# Altium integrated library Weidmueller_OMNIMATE_Signal.IntLib: 2550 symbols (part 39 of 45)
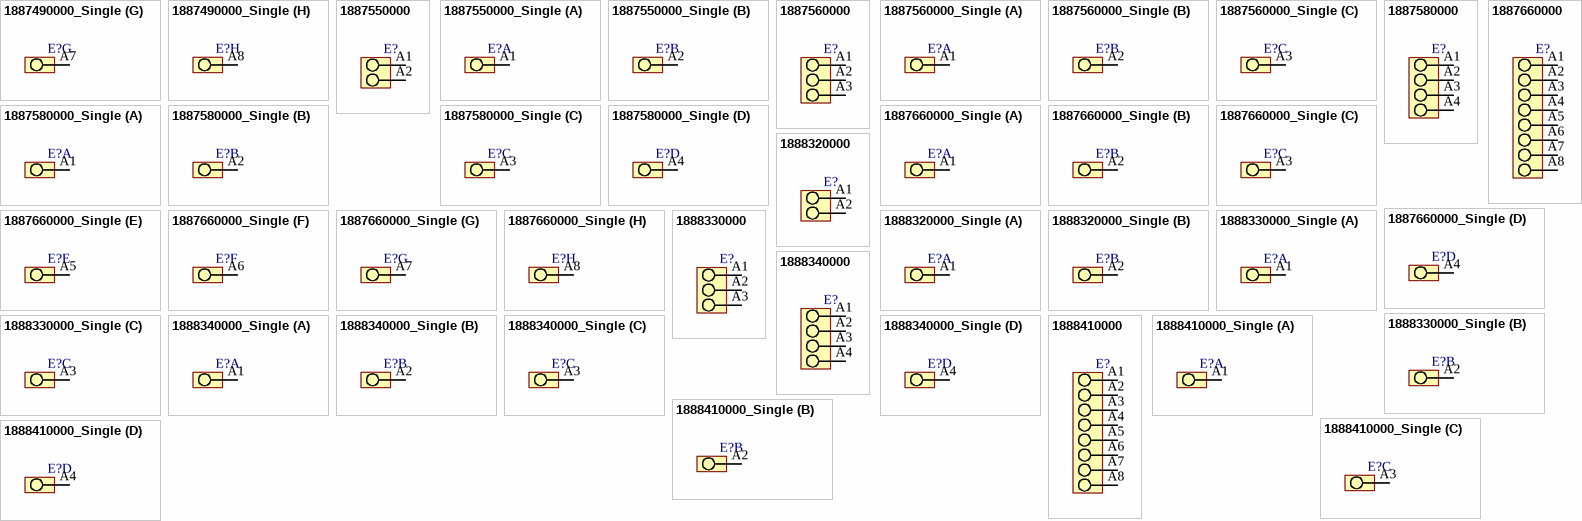
[diagram p249: symbols 1887490000_Single to 1888410000_Single]

## 1887550000
designator E?
OMNIMATE Signal - series LSF; PartNumber: 1887550000; Manufacturer: Weidmueller; Short_text_for_material: LSF-SMT 3.50/02/135 1.5SN BK RL; Side_termination_characteristic: closed side; Mounting_onto_the_PCB: Reflow solder connection; Pitch_mm: 3,5 mm; Pitch_inch: 0,138 inch; No_of_poles: 2; Solder_pin_length_mm: 1,5 mm; Contact_material: Cu-Leg; Contact_surface: tinned; Insulating_material: LCP GF; UL_94_flammability_rating: V-0; Rated_voltage_for_surge_voltage_class_pollution_degree_II_2: 320 V; Rated_current_min_no_of_poles_TU_20_deg_C: 17,5 A; Solid_min_H05_07_V_U: 0,2 mm²; Solid_max_H05_07_V_U: 1,5 mm²; Rated_voltage_use_group_B_UL_1059: 300 V; Rated_current_use_group_B_UL_1059: 12 A; Wire_cross_section_AWG_min_UL_1059: AWG 24; Wire_cross_section_AWG_max_UL_1059: AWG 16; PackageReference: LSF_SMT_3_5_135_02; Colour: Black; Packaging: Tape; Qty: 190 PCS; Revision: V1; ComponentLink1Description: Manufacturer URL; ComponentLink1URL: http://www.weidmueller.com/; ComponentLink2Description: URL Link1; ComponentLink2URL: http://catalog.weidmueller.com/catalog/Start.do?localeId=en&ObjectID=1887550000
footprint LSF_SMT_3_5_135_02 (OMNIMATE Signal - Serie LSF  LSF-SMT 3.50/02/135 1.5)
pins: A1, A2
1 alternate drawing of the same symbol

## 1887550000_Single
designator E?
OMNIMATE Signal - series LSF; PartNumber: 1887550000; Manufacturer: Weidmueller; Short_text_for_material: LSF-SMT 3.50/02/135 1.5SN BK RL; Side_termination_characteristic: closed side; Mounting_onto_the_PCB: Reflow solder connection; Pitch_mm: 3,5 mm; Pitch_inch: 0,138 inch; No_of_poles: 2; Solder_pin_length_mm: 1,5 mm; Contact_material: Cu-Leg; Contact_surface: tinned; Insulating_material: LCP GF; UL_94_flammability_rating: V-0; Rated_voltage_for_surge_voltage_class_pollution_degree_II_2: 320 V; Rated_current_min_no_of_poles_TU_20_deg_C: 17,5 A; Solid_min_H05_07_V_U: 0,2 mm²; Solid_max_H05_07_V_U: 1,5 mm²; Rated_voltage_use_group_B_UL_1059: 300 V; Rated_current_use_group_B_UL_1059: 12 A; Wire_cross_section_AWG_min_UL_1059: AWG 24; Wire_cross_section_AWG_max_UL_1059: AWG 16; PackageReference: LSF_SMT_3_5_135_02; Colour: Black; Packaging: Tape; Qty: 190 PCS; Revision: V1; ComponentLink1Description: Manufacturer URL; ComponentLink1URL: http://www.weidmueller.com/; ComponentLink2Description: URL Link1; ComponentLink2URL: http://catalog.weidmueller.com/catalog/Start.do?localeId=en&ObjectID=1887550000
footprint LSF_SMT_3_5_135_02 (OMNIMATE Signal - Serie LSF  LSF-SMT 3.50/02/135 1.5)
part A pins: A1
part B pins: A2
1 alternate drawing of the same symbol

## 1887560000
designator E?
OMNIMATE Signal - series LSF; PartNumber: 1887560000; Manufacturer: Weidmueller; Short_text_for_material: LSF-SMT 3.50/03/135 1.5SN BK RL; Side_termination_characteristic: closed side; Mounting_onto_the_PCB: Reflow solder connection; Pitch_mm: 3,5 mm; Pitch_inch: 0,138 inch; No_of_poles: 3; Solder_pin_length_mm: 1,5 mm; Contact_material: Cu-Leg; Contact_surface: tinned; Insulating_material: LCP GF; UL_94_flammability_rating: V-0; Rated_voltage_for_surge_voltage_class_pollution_degree_II_2: 320 V; Rated_current_min_no_of_poles_TU_20_deg_C: 17,5 A; Solid_min_H05_07_V_U: 0,2 mm²; Solid_max_H05_07_V_U: 1,5 mm²; Rated_voltage_use_group_B_UL_1059: 300 V; Rated_current_use_group_B_UL_1059: 12 A; Wire_cross_section_AWG_min_UL_1059: AWG 24; Wire_cross_section_AWG_max_UL_1059: AWG 16; PackageReference: LSF_SMT_3_5_135_03; Colour: Black; Packaging: Tape; Qty: 190 PCS; Revision: V1; ComponentLink1Description: Manufacturer URL; ComponentLink1URL: http://www.weidmueller.com/; ComponentLink2Description: URL Link1; ComponentLink2URL: http://catalog.weidmueller.com/catalog/Start.do?localeId=en&ObjectID=1887560000
footprint LSF_SMT_3_5_135_03 (OMNIMATE Signal - Serie LSF  LSF-SMT 3.50/03/135 1.5)
pins: A1, A2, A3
1 alternate drawing of the same symbol

## 1887560000_Single
designator E?
OMNIMATE Signal - series LSF; PartNumber: 1887560000; Manufacturer: Weidmueller; Short_text_for_material: LSF-SMT 3.50/03/135 1.5SN BK RL; Side_termination_characteristic: closed side; Mounting_onto_the_PCB: Reflow solder connection; Pitch_mm: 3,5 mm; Pitch_inch: 0,138 inch; No_of_poles: 3; Solder_pin_length_mm: 1,5 mm; Contact_material: Cu-Leg; Contact_surface: tinned; Insulating_material: LCP GF; UL_94_flammability_rating: V-0; Rated_voltage_for_surge_voltage_class_pollution_degree_II_2: 320 V; Rated_current_min_no_of_poles_TU_20_deg_C: 17,5 A; Solid_min_H05_07_V_U: 0,2 mm²; Solid_max_H05_07_V_U: 1,5 mm²; Rated_voltage_use_group_B_UL_1059: 300 V; Rated_current_use_group_B_UL_1059: 12 A; Wire_cross_section_AWG_min_UL_1059: AWG 24; Wire_cross_section_AWG_max_UL_1059: AWG 16; PackageReference: LSF_SMT_3_5_135_03; Colour: Black; Packaging: Tape; Qty: 190 PCS; Revision: V1; ComponentLink1Description: Manufacturer URL; ComponentLink1URL: http://www.weidmueller.com/; ComponentLink2Description: URL Link1; ComponentLink2URL: http://catalog.weidmueller.com/catalog/Start.do?localeId=en&ObjectID=1887560000
footprint LSF_SMT_3_5_135_03 (OMNIMATE Signal - Serie LSF  LSF-SMT 3.50/03/135 1.5)
part A pins: A1
part B pins: A2
part C pins: A3
1 alternate drawing of the same symbol

## 1887580000
designator E?
OMNIMATE Signal - series LSF; PartNumber: 1887580000; Manufacturer: Weidmueller; Short_text_for_material: LSF-SMT 3.50/04/135 1.5SN BK RL; Side_termination_characteristic: closed side; Mounting_onto_the_PCB: Reflow solder connection; Pitch_mm: 3,5 mm; Pitch_inch: 0,138 inch; No_of_poles: 4; Solder_pin_length_mm: 1,5 mm; Contact_material: Cu-Leg; Contact_surface: tinned; Insulating_material: LCP GF; UL_94_flammability_rating: V-0; Rated_voltage_for_surge_voltage_class_pollution_degree_II_2: 320 V; Rated_current_min_no_of_poles_TU_20_deg_C: 17,5 A; Solid_min_H05_07_V_U: 0,2 mm²; Solid_max_H05_07_V_U: 1,5 mm²; Rated_voltage_use_group_B_UL_1059: 300 V; Rated_current_use_group_B_UL_1059: 12 A; Wire_cross_section_AWG_min_UL_1059: AWG 24; Wire_cross_section_AWG_max_UL_1059: AWG 16; PackageReference: LSF_SMT_3_5_135_04; Colour: Black; Packaging: Tape; Qty: 190 PCS; Revision: V1; ComponentLink1Description: Manufacturer URL; ComponentLink1URL: http://www.weidmueller.com/; ComponentLink2Description: URL Link1; ComponentLink2URL: http://catalog.weidmueller.com/catalog/Start.do?localeId=en&ObjectID=1887580000
footprint LSF_SMT_3_5_135_04 (OMNIMATE Signal - Serie LSF  LSF-SMT 3.50/04/135 1.5)
pins: A1, A2, A3, A4
1 alternate drawing of the same symbol

## 1887580000_Single
designator E?
OMNIMATE Signal - series LSF; PartNumber: 1887580000; Manufacturer: Weidmueller; Short_text_for_material: LSF-SMT 3.50/04/135 1.5SN BK RL; Side_termination_characteristic: closed side; Mounting_onto_the_PCB: Reflow solder connection; Pitch_mm: 3,5 mm; Pitch_inch: 0,138 inch; No_of_poles: 4; Solder_pin_length_mm: 1,5 mm; Contact_material: Cu-Leg; Contact_surface: tinned; Insulating_material: LCP GF; UL_94_flammability_rating: V-0; Rated_voltage_for_surge_voltage_class_pollution_degree_II_2: 320 V; Rated_current_min_no_of_poles_TU_20_deg_C: 17,5 A; Solid_min_H05_07_V_U: 0,2 mm²; Solid_max_H05_07_V_U: 1,5 mm²; Rated_voltage_use_group_B_UL_1059: 300 V; Rated_current_use_group_B_UL_1059: 12 A; Wire_cross_section_AWG_min_UL_1059: AWG 24; Wire_cross_section_AWG_max_UL_1059: AWG 16; PackageReference: LSF_SMT_3_5_135_04; Colour: Black; Packaging: Tape; Qty: 190 PCS; Revision: V1; ComponentLink1Description: Manufacturer URL; ComponentLink1URL: http://www.weidmueller.com/; ComponentLink2Description: URL Link1; ComponentLink2URL: http://catalog.weidmueller.com/catalog/Start.do?localeId=en&ObjectID=1887580000
footprint LSF_SMT_3_5_135_04 (OMNIMATE Signal - Serie LSF  LSF-SMT 3.50/04/135 1.5)
part A pins: A1
part B pins: A2
part C pins: A3
part D pins: A4
1 alternate drawing of the same symbol

## 1887660000
designator E?
OMNIMATE Signal - series LSF; PartNumber: 1887660000; Manufacturer: Weidmueller; Short_text_for_material: LSF-SMT 3.50/08/135 1.5SN BK RL; Side_termination_characteristic: closed side; Mounting_onto_the_PCB: Reflow solder connection; Pitch_mm: 3,5 mm; Pitch_inch: 0,138 inch; No_of_poles: 8; Solder_pin_length_mm: 1,5 mm; Contact_material: Cu-Leg; Contact_surface: tinned; Insulating_material: LCP GF; UL_94_flammability_rating: V-0; Rated_voltage_for_surge_voltage_class_pollution_degree_II_2: 320 V; Rated_current_min_no_of_poles_TU_20_deg_C: 17,5 A; Solid_min_H05_07_V_U: 0,2 mm²; Solid_max_H05_07_V_U: 1,5 mm²; Rated_voltage_use_group_B_UL_1059: 300 V; Rated_current_use_group_B_UL_1059: 12 A; Wire_cross_section_AWG_min_UL_1059: AWG 24; Wire_cross_section_AWG_max_UL_1059: AWG 16; PackageReference: LSF_SMT_3_5_135_08; Colour: Black; Packaging: Tape; Qty: 190 PCS; Revision: V1; ComponentLink1Description: Manufacturer URL; ComponentLink1URL: http://www.weidmueller.com/; ComponentLink2Description: URL Link1; ComponentLink2URL: http://catalog.weidmueller.com/catalog/Start.do?localeId=en&ObjectID=1887660000
footprint LSF_SMT_3_5_135_08 (OMNIMATE Signal - Serie LSF  LSF-SMT 3.50/08/135 1.5)
pins: A1, A2, A3, A4, A5, A6, A7, A8
1 alternate drawing of the same symbol

## 1887660000_Single
designator E?
OMNIMATE Signal - series LSF; PartNumber: 1887660000; Manufacturer: Weidmueller; Short_text_for_material: LSF-SMT 3.50/08/135 1.5SN BK RL; Side_termination_characteristic: closed side; Mounting_onto_the_PCB: Reflow solder connection; Pitch_mm: 3,5 mm; Pitch_inch: 0,138 inch; No_of_poles: 8; Solder_pin_length_mm: 1,5 mm; Contact_material: Cu-Leg; Contact_surface: tinned; Insulating_material: LCP GF; UL_94_flammability_rating: V-0; Rated_voltage_for_surge_voltage_class_pollution_degree_II_2: 320 V; Rated_current_min_no_of_poles_TU_20_deg_C: 17,5 A; Solid_min_H05_07_V_U: 0,2 mm²; Solid_max_H05_07_V_U: 1,5 mm²; Rated_voltage_use_group_B_UL_1059: 300 V; Rated_current_use_group_B_UL_1059: 12 A; Wire_cross_section_AWG_min_UL_1059: AWG 24; Wire_cross_section_AWG_max_UL_1059: AWG 16; PackageReference: LSF_SMT_3_5_135_08; Colour: Black; Packaging: Tape; Qty: 190 PCS; Revision: V1; ComponentLink1Description: Manufacturer URL; ComponentLink1URL: http://www.weidmueller.com/; ComponentLink2Description: URL Link1; ComponentLink2URL: http://catalog.weidmueller.com/catalog/Start.do?localeId=en&ObjectID=1887660000
footprint LSF_SMT_3_5_135_08 (OMNIMATE Signal - Serie LSF  LSF-SMT 3.50/08/135 1.5)
part A pins: A1
part B pins: A2
part C pins: A3
part D pins: A4
part E pins: A5
part F pins: A6
part G pins: A7
part H pins: A8
1 alternate drawing of the same symbol

## 1888320000
designator E?
OMNIMATE Signal - series LSF; PartNumber: 1888320000; Manufacturer: Weidmueller; Short_text_for_material: LSF-SMT 3.81/02/135 3.5SN BK RL; Side_termination_characteristic: closed side; Mounting_onto_the_PCB: Reflow solder connection; Pitch_mm: 3,81 mm; Pitch_inch: 0,15 inch; No_of_poles: 2; Solder_pin_length_mm: 3,5 mm; Contact_material: Cu-Leg; Contact_surface: tinned; Insulating_material: LCP GF; UL_94_flammability_rating: V-0; Rated_voltage_for_surge_voltage_class_pollution_degree_II_2: 320 V; Rated_current_min_no_of_poles_TU_20_deg_C: 17,5 A; Solid_min_H05_07_V_U: 0,2 mm²; Solid_max_H05_07_V_U: 1,5 mm²; Rated_voltage_use_group_B_UL_1059: 300 V; Rated_current_use_group_B_UL_1059: 12 A; Wire_cross_section_AWG_min_UL_1059: AWG 24; Wire_cross_section_AWG_max_UL_1059: AWG 16; PackageReference: LSF_SMT_3_81_135_02; Colour: Black; Packaging: Tape; Qty: 175 PCS; Revision: V1; ComponentLink1Description: Manufacturer URL; ComponentLink1URL: http://www.weidmueller.com/; ComponentLink2Description: URL Link1; ComponentLink2URL: http://catalog.weidmueller.com/catalog/Start.do?localeId=en&ObjectID=1888320000
footprint LSF_SMT_3_81_135_02 (OMNIMATE Signal - Serie LSF  LSF-SMT 3.81/02/135 1.5)
pins: A1, A2
1 alternate drawing of the same symbol

## 1888320000_Single
designator E?
OMNIMATE Signal - series LSF; PartNumber: 1888320000; Manufacturer: Weidmueller; Short_text_for_material: LSF-SMT 3.81/02/135 3.5SN BK RL; Side_termination_characteristic: closed side; Mounting_onto_the_PCB: Reflow solder connection; Pitch_mm: 3,81 mm; Pitch_inch: 0,15 inch; No_of_poles: 2; Solder_pin_length_mm: 3,5 mm; Contact_material: Cu-Leg; Contact_surface: tinned; Insulating_material: LCP GF; UL_94_flammability_rating: V-0; Rated_voltage_for_surge_voltage_class_pollution_degree_II_2: 320 V; Rated_current_min_no_of_poles_TU_20_deg_C: 17,5 A; Solid_min_H05_07_V_U: 0,2 mm²; Solid_max_H05_07_V_U: 1,5 mm²; Rated_voltage_use_group_B_UL_1059: 300 V; Rated_current_use_group_B_UL_1059: 12 A; Wire_cross_section_AWG_min_UL_1059: AWG 24; Wire_cross_section_AWG_max_UL_1059: AWG 16; PackageReference: LSF_SMT_3_81_135_02; Colour: Black; Packaging: Tape; Qty: 175 PCS; Revision: V1; ComponentLink1Description: Manufacturer URL; ComponentLink1URL: http://www.weidmueller.com/; ComponentLink2Description: URL Link1; ComponentLink2URL: http://catalog.weidmueller.com/catalog/Start.do?localeId=en&ObjectID=1888320000
footprint LSF_SMT_3_81_135_02 (OMNIMATE Signal - Serie LSF  LSF-SMT 3.81/02/135 1.5)
part A pins: A1
part B pins: A2
1 alternate drawing of the same symbol

## 1888330000
designator E?
OMNIMATE Signal - series LSF; PartNumber: 1888330000; Manufacturer: Weidmueller; Short_text_for_material: LSF-SMT 3.81/03/135 3.5SN BK RL; Side_termination_characteristic: closed side; Mounting_onto_the_PCB: Reflow solder connection; Pitch_mm: 3,81 mm; Pitch_inch: 0,15 inch; No_of_poles: 3; Solder_pin_length_mm: 3,5 mm; Contact_material: Cu-Leg; Contact_surface: tinned; Insulating_material: LCP GF; UL_94_flammability_rating: V-0; Rated_voltage_for_surge_voltage_class_pollution_degree_II_2: 320 V; Rated_current_min_no_of_poles_TU_20_deg_C: 17,5 A; Solid_min_H05_07_V_U: 0,2 mm²; Solid_max_H05_07_V_U: 1,5 mm²; Rated_voltage_use_group_B_UL_1059: 300 V; Rated_current_use_group_B_UL_1059: 12 A; Wire_cross_section_AWG_min_UL_1059: AWG 24; Wire_cross_section_AWG_max_UL_1059: AWG 16; PackageReference: LSF_SMT_3_81_135_03; Colour: Black; Packaging: Tape; Qty: 190 PCS; Revision: V1; ComponentLink1Description: Manufacturer URL; ComponentLink1URL: http://www.weidmueller.com/; ComponentLink2Description: URL Link1; ComponentLink2URL: http://catalog.weidmueller.com/catalog/Start.do?localeId=en&ObjectID=1888330000
footprint LSF_SMT_3_81_135_03 (OMNIMATE Signal - Serie LSF  LSF-SMT 3.81/03/135 1.5)
pins: A1, A2, A3
1 alternate drawing of the same symbol

## 1888330000_Single
designator E?
OMNIMATE Signal - series LSF; PartNumber: 1888330000; Manufacturer: Weidmueller; Short_text_for_material: LSF-SMT 3.81/03/135 3.5SN BK RL; Side_termination_characteristic: closed side; Mounting_onto_the_PCB: Reflow solder connection; Pitch_mm: 3,81 mm; Pitch_inch: 0,15 inch; No_of_poles: 3; Solder_pin_length_mm: 3,5 mm; Contact_material: Cu-Leg; Contact_surface: tinned; Insulating_material: LCP GF; UL_94_flammability_rating: V-0; Rated_voltage_for_surge_voltage_class_pollution_degree_II_2: 320 V; Rated_current_min_no_of_poles_TU_20_deg_C: 17,5 A; Solid_min_H05_07_V_U: 0,2 mm²; Solid_max_H05_07_V_U: 1,5 mm²; Rated_voltage_use_group_B_UL_1059: 300 V; Rated_current_use_group_B_UL_1059: 12 A; Wire_cross_section_AWG_min_UL_1059: AWG 24; Wire_cross_section_AWG_max_UL_1059: AWG 16; PackageReference: LSF_SMT_3_81_135_03; Colour: Black; Packaging: Tape; Qty: 190 PCS; Revision: V1; ComponentLink1Description: Manufacturer URL; ComponentLink1URL: http://www.weidmueller.com/; ComponentLink2Description: URL Link1; ComponentLink2URL: http://catalog.weidmueller.com/catalog/Start.do?localeId=en&ObjectID=1888330000
footprint LSF_SMT_3_81_135_03 (OMNIMATE Signal - Serie LSF  LSF-SMT 3.81/03/135 1.5)
part A pins: A1
part B pins: A2
part C pins: A3
1 alternate drawing of the same symbol

## 1888340000
designator E?
OMNIMATE Signal - series LSF; PartNumber: 1888340000; Manufacturer: Weidmueller; Short_text_for_material: LSF-SMT 3.81/04/135 3.5SN BK RL; Side_termination_characteristic: closed side; Mounting_onto_the_PCB: Reflow solder connection; Pitch_mm: 3,81 mm; Pitch_inch: 0,15 inch; No_of_poles: 4; Solder_pin_length_mm: 3,5 mm; Contact_material: Cu-Leg; Contact_surface: tinned; Insulating_material: LCP GF; UL_94_flammability_rating: V-0; Rated_voltage_for_surge_voltage_class_pollution_degree_II_2: 320 V; Rated_current_min_no_of_poles_TU_20_deg_C: 17,5 A; Solid_min_H05_07_V_U: 0,2 mm²; Solid_max_H05_07_V_U: 1,5 mm²; Rated_voltage_use_group_B_UL_1059: 300 V; Rated_current_use_group_B_UL_1059: 12 A; Wire_cross_section_AWG_min_UL_1059: AWG 24; Wire_cross_section_AWG_max_UL_1059: AWG 16; PackageReference: LSF_SMT_3_81_135_04; Colour: Black; Packaging: Tape; Qty: 190 PCS; Revision: V1; ComponentLink1Description: Manufacturer URL; ComponentLink1URL: http://www.weidmueller.com/; ComponentLink2Description: URL Link1; ComponentLink2URL: http://catalog.weidmueller.com/catalog/Start.do?localeId=en&ObjectID=1888340000
footprint LSF_SMT_3_81_135_04 (OMNIMATE Signal - Serie LSF  LSF-SMT 3.81/04/135 1.5)
pins: A1, A2, A3, A4
1 alternate drawing of the same symbol

## 1888340000_Single
designator E?
OMNIMATE Signal - series LSF; PartNumber: 1888340000; Manufacturer: Weidmueller; Short_text_for_material: LSF-SMT 3.81/04/135 3.5SN BK RL; Side_termination_characteristic: closed side; Mounting_onto_the_PCB: Reflow solder connection; Pitch_mm: 3,81 mm; Pitch_inch: 0,15 inch; No_of_poles: 4; Solder_pin_length_mm: 3,5 mm; Contact_material: Cu-Leg; Contact_surface: tinned; Insulating_material: LCP GF; UL_94_flammability_rating: V-0; Rated_voltage_for_surge_voltage_class_pollution_degree_II_2: 320 V; Rated_current_min_no_of_poles_TU_20_deg_C: 17,5 A; Solid_min_H05_07_V_U: 0,2 mm²; Solid_max_H05_07_V_U: 1,5 mm²; Rated_voltage_use_group_B_UL_1059: 300 V; Rated_current_use_group_B_UL_1059: 12 A; Wire_cross_section_AWG_min_UL_1059: AWG 24; Wire_cross_section_AWG_max_UL_1059: AWG 16; PackageReference: LSF_SMT_3_81_135_04; Colour: Black; Packaging: Tape; Qty: 190 PCS; Revision: V1; ComponentLink1Description: Manufacturer URL; ComponentLink1URL: http://www.weidmueller.com/; ComponentLink2Description: URL Link1; ComponentLink2URL: http://catalog.weidmueller.com/catalog/Start.do?localeId=en&ObjectID=1888340000
footprint LSF_SMT_3_81_135_04 (OMNIMATE Signal - Serie LSF  LSF-SMT 3.81/04/135 1.5)
part A pins: A1
part B pins: A2
part C pins: A3
part D pins: A4
1 alternate drawing of the same symbol

## 1888410000
designator E?
OMNIMATE Signal - series LSF; PartNumber: 1888410000; Manufacturer: Weidmueller; Short_text_for_material: LSF-SMT 3.81/08/135 3.5SN BK RL; Side_termination_characteristic: closed side; Mounting_onto_the_PCB: Reflow solder connection; Pitch_mm: 3,81 mm; Pitch_inch: 0,15 inch; No_of_poles: 8; Solder_pin_length_mm: 3,5 mm; Contact_material: Cu-Leg; Contact_surface: tinned; Insulating_material: LCP GF; UL_94_flammability_rating: V-0; Rated_voltage_for_surge_voltage_class_pollution_degree_II_2: 320 V; Rated_current_min_no_of_poles_TU_20_deg_C: 17,5 A; Solid_min_H05_07_V_U: 0,2 mm²; Solid_max_H05_07_V_U: 1,5 mm²; Rated_voltage_use_group_B_UL_1059: 300 V; Rated_current_use_group_B_UL_1059: 12 A; Wire_cross_section_AWG_min_UL_1059: AWG 24; Wire_cross_section_AWG_max_UL_1059: AWG 16; PackageReference: LSF_SMT_3_81_135_08; Colour: Black; Packaging: Tape; Qty: 190 PCS; Revision: V1; ComponentLink1Description: Manufacturer URL; ComponentLink1URL: http://www.weidmueller.com/; ComponentLink2Description: URL Link1; ComponentLink2URL: http://catalog.weidmueller.com/catalog/Start.do?localeId=en&ObjectID=1888410000
footprint LSF_SMT_3_81_135_08 (OMNIMATE Signal - Serie LSF  LSF-SMT 3.81/08/135 1.5)
pins: A1, A2, A3, A4, A5, A6, A7, A8
1 alternate drawing of the same symbol

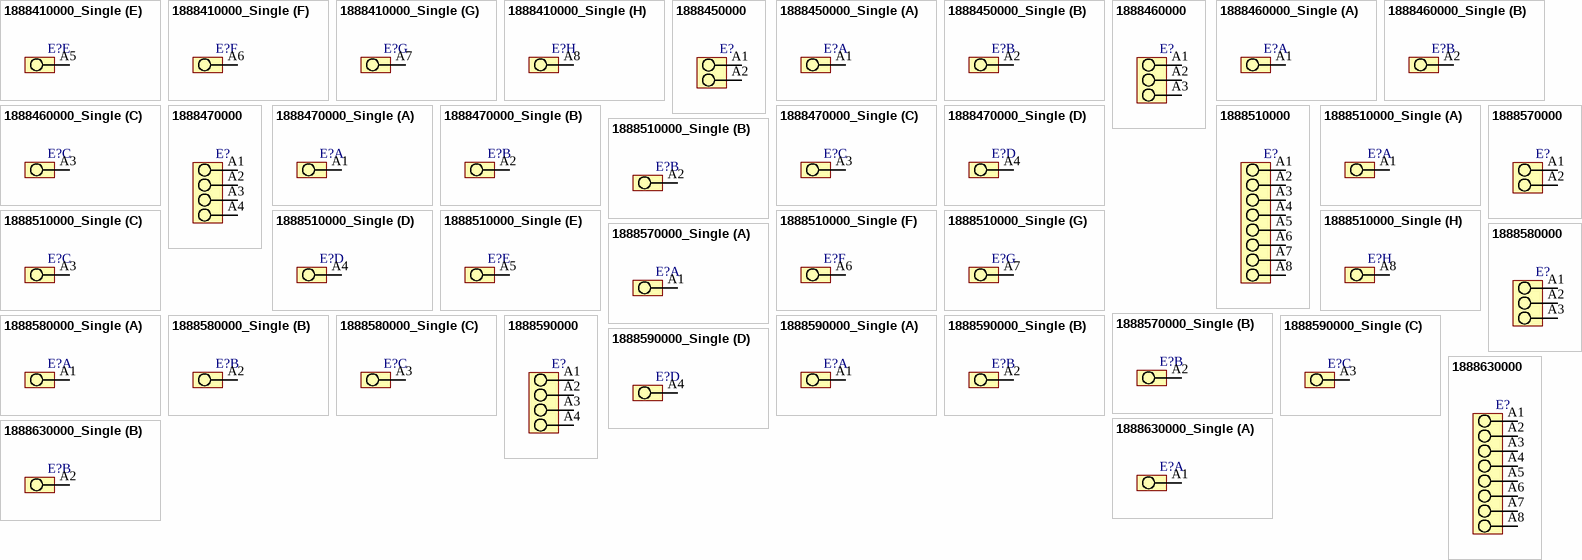
[diagram p181: symbols 1888410000_Single to 1888630000_Single]

## 1888410000_Single
designator E?
OMNIMATE Signal - series LSF; PartNumber: 1888410000; Manufacturer: Weidmueller; Short_text_for_material: LSF-SMT 3.81/08/135 3.5SN BK RL; Side_termination_characteristic: closed side; Mounting_onto_the_PCB: Reflow solder connection; Pitch_mm: 3,81 mm; Pitch_inch: 0,15 inch; No_of_poles: 8; Solder_pin_length_mm: 3,5 mm; Contact_material: Cu-Leg; Contact_surface: tinned; Insulating_material: LCP GF; UL_94_flammability_rating: V-0; Rated_voltage_for_surge_voltage_class_pollution_degree_II_2: 320 V; Rated_current_min_no_of_poles_TU_20_deg_C: 17,5 A; Solid_min_H05_07_V_U: 0,2 mm²; Solid_max_H05_07_V_U: 1,5 mm²; Rated_voltage_use_group_B_UL_1059: 300 V; Rated_current_use_group_B_UL_1059: 12 A; Wire_cross_section_AWG_min_UL_1059: AWG 24; Wire_cross_section_AWG_max_UL_1059: AWG 16; PackageReference: LSF_SMT_3_81_135_08; Colour: Black; Packaging: Tape; Qty: 190 PCS; Revision: V1; ComponentLink1Description: Manufacturer URL; ComponentLink1URL: http://www.weidmueller.com/; ComponentLink2Description: URL Link1; ComponentLink2URL: http://catalog.weidmueller.com/catalog/Start.do?localeId=en&ObjectID=1888410000
footprint LSF_SMT_3_81_135_08 (OMNIMATE Signal - Serie LSF  LSF-SMT 3.81/08/135 1.5)
part A pins: A1
part B pins: A2
part C pins: A3
part D pins: A4
part E pins: A5
part F pins: A6
part G pins: A7
part H pins: A8
1 alternate drawing of the same symbol

## 1888450000
designator E?
OMNIMATE Signal - series LSF; PartNumber: 1888450000; Manufacturer: Weidmueller; Short_text_for_material: LSF-SMT 3.81/02/135 1.5SN BK RL; Side_termination_characteristic: closed side; Mounting_onto_the_PCB: Reflow solder connection; Pitch_mm: 3,81 mm; Pitch_inch: 0,15 inch; No_of_poles: 2; Solder_pin_length_mm: 1,5 mm; Contact_material: Cu-Leg; Contact_surface: tinned; Insulating_material: LCP GF; UL_94_flammability_rating: V-0; Rated_voltage_for_surge_voltage_class_pollution_degree_II_2: 320 V; Rated_current_min_no_of_poles_TU_20_deg_C: 17,5 A; Solid_min_H05_07_V_U: 0,2 mm²; Solid_max_H05_07_V_U: 1,5 mm²; Rated_voltage_use_group_B_UL_1059: 300 V; Rated_current_use_group_B_UL_1059: 12 A; Wire_cross_section_AWG_min_UL_1059: AWG 24; Wire_cross_section_AWG_max_UL_1059: AWG 16; PackageReference: LSF_SMT_3_81_135_02; Colour: Black; Packaging: Tape; Qty: 175 PCS; Revision: V1; ComponentLink1Description: Manufacturer URL; ComponentLink1URL: http://www.weidmueller.com/; ComponentLink2Description: URL Link1; ComponentLink2URL: http://catalog.weidmueller.com/catalog/Start.do?localeId=en&ObjectID=1888450000
footprint LSF_SMT_3_81_135_02 (OMNIMATE Signal - Serie LSF  LSF-SMT 3.81/02/135 1.5)
pins: A1, A2
1 alternate drawing of the same symbol

## 1888450000_Single
designator E?
OMNIMATE Signal - series LSF; PartNumber: 1888450000; Manufacturer: Weidmueller; Short_text_for_material: LSF-SMT 3.81/02/135 1.5SN BK RL; Side_termination_characteristic: closed side; Mounting_onto_the_PCB: Reflow solder connection; Pitch_mm: 3,81 mm; Pitch_inch: 0,15 inch; No_of_poles: 2; Solder_pin_length_mm: 1,5 mm; Contact_material: Cu-Leg; Contact_surface: tinned; Insulating_material: LCP GF; UL_94_flammability_rating: V-0; Rated_voltage_for_surge_voltage_class_pollution_degree_II_2: 320 V; Rated_current_min_no_of_poles_TU_20_deg_C: 17,5 A; Solid_min_H05_07_V_U: 0,2 mm²; Solid_max_H05_07_V_U: 1,5 mm²; Rated_voltage_use_group_B_UL_1059: 300 V; Rated_current_use_group_B_UL_1059: 12 A; Wire_cross_section_AWG_min_UL_1059: AWG 24; Wire_cross_section_AWG_max_UL_1059: AWG 16; PackageReference: LSF_SMT_3_81_135_02; Colour: Black; Packaging: Tape; Qty: 175 PCS; Revision: V1; ComponentLink1Description: Manufacturer URL; ComponentLink1URL: http://www.weidmueller.com/; ComponentLink2Description: URL Link1; ComponentLink2URL: http://catalog.weidmueller.com/catalog/Start.do?localeId=en&ObjectID=1888450000
footprint LSF_SMT_3_81_135_02 (OMNIMATE Signal - Serie LSF  LSF-SMT 3.81/02/135 1.5)
part A pins: A1
part B pins: A2
1 alternate drawing of the same symbol

## 1888460000
designator E?
OMNIMATE Signal - series LSF; PartNumber: 1888460000; Manufacturer: Weidmueller; Short_text_for_material: LSF-SMT 3.81/03/135 1.5SN BK RL; Side_termination_characteristic: closed side; Mounting_onto_the_PCB: Reflow solder connection; Pitch_mm: 3,81 mm; Pitch_inch: 0,15 inch; No_of_poles: 3; Solder_pin_length_mm: 1,5 mm; Contact_material: Cu-Leg; Contact_surface: tinned; Insulating_material: LCP GF; UL_94_flammability_rating: V-0; Rated_voltage_for_surge_voltage_class_pollution_degree_II_2: 320 V; Rated_current_min_no_of_poles_TU_20_deg_C: 17,5 A; Solid_min_H05_07_V_U: 0,2 mm²; Solid_max_H05_07_V_U: 1,5 mm²; Rated_voltage_use_group_B_UL_1059: 300 V; Rated_current_use_group_B_UL_1059: 12 A; Wire_cross_section_AWG_min_UL_1059: AWG 24; Wire_cross_section_AWG_max_UL_1059: AWG 16; PackageReference: LSF_SMT_3_81_135_03; Colour: Black; Packaging: Tape; Qty: 190 PCS; Revision: V1; ComponentLink1Description: Manufacturer URL; ComponentLink1URL: http://www.weidmueller.com/; ComponentLink2Description: URL Link1; ComponentLink2URL: http://catalog.weidmueller.com/catalog/Start.do?localeId=en&ObjectID=1888460000
footprint LSF_SMT_3_81_135_03 (OMNIMATE Signal - Serie LSF  LSF-SMT 3.81/03/135 1.5)
pins: A1, A2, A3
1 alternate drawing of the same symbol

## 1888460000_Single
designator E?
OMNIMATE Signal - series LSF; PartNumber: 1888460000; Manufacturer: Weidmueller; Short_text_for_material: LSF-SMT 3.81/03/135 1.5SN BK RL; Side_termination_characteristic: closed side; Mounting_onto_the_PCB: Reflow solder connection; Pitch_mm: 3,81 mm; Pitch_inch: 0,15 inch; No_of_poles: 3; Solder_pin_length_mm: 1,5 mm; Contact_material: Cu-Leg; Contact_surface: tinned; Insulating_material: LCP GF; UL_94_flammability_rating: V-0; Rated_voltage_for_surge_voltage_class_pollution_degree_II_2: 320 V; Rated_current_min_no_of_poles_TU_20_deg_C: 17,5 A; Solid_min_H05_07_V_U: 0,2 mm²; Solid_max_H05_07_V_U: 1,5 mm²; Rated_voltage_use_group_B_UL_1059: 300 V; Rated_current_use_group_B_UL_1059: 12 A; Wire_cross_section_AWG_min_UL_1059: AWG 24; Wire_cross_section_AWG_max_UL_1059: AWG 16; PackageReference: LSF_SMT_3_81_135_03; Colour: Black; Packaging: Tape; Qty: 190 PCS; Revision: V1; ComponentLink1Description: Manufacturer URL; ComponentLink1URL: http://www.weidmueller.com/; ComponentLink2Description: URL Link1; ComponentLink2URL: http://catalog.weidmueller.com/catalog/Start.do?localeId=en&ObjectID=1888460000
footprint LSF_SMT_3_81_135_03 (OMNIMATE Signal - Serie LSF  LSF-SMT 3.81/03/135 1.5)
part A pins: A1
part B pins: A2
part C pins: A3
1 alternate drawing of the same symbol

## 1888470000
designator E?
OMNIMATE Signal - series LSF; PartNumber: 1888470000; Manufacturer: Weidmueller; Short_text_for_material: LSF-SMT 3.81/04/135 1.5SN BK RL; Side_termination_characteristic: closed side; Mounting_onto_the_PCB: Reflow solder connection; Pitch_mm: 3,81 mm; Pitch_inch: 0,15 inch; No_of_poles: 4; Solder_pin_length_mm: 1,5 mm; Contact_material: Cu-Leg; Contact_surface: tinned; Insulating_material: LCP GF; UL_94_flammability_rating: V-0; Rated_voltage_for_surge_voltage_class_pollution_degree_II_2: 320 V; Rated_current_min_no_of_poles_TU_20_deg_C: 17,5 A; Solid_min_H05_07_V_U: 0,2 mm²; Solid_max_H05_07_V_U: 1,5 mm²; Rated_voltage_use_group_B_UL_1059: 300 V; Rated_current_use_group_B_UL_1059: 12 A; Wire_cross_section_AWG_min_UL_1059: AWG 24; Wire_cross_section_AWG_max_UL_1059: AWG 16; PackageReference: LSF_SMT_3_81_135_04; Colour: Black; Packaging: Tape; Qty: 190 PCS; Revision: V1; ComponentLink1Description: Manufacturer URL; ComponentLink1URL: http://www.weidmueller.com/; ComponentLink2Description: URL Link1; ComponentLink2URL: http://catalog.weidmueller.com/catalog/Start.do?localeId=en&ObjectID=1888470000
footprint LSF_SMT_3_81_135_04 (OMNIMATE Signal - Serie LSF  LSF-SMT 3.81/04/135 1.5)
pins: A1, A2, A3, A4
1 alternate drawing of the same symbol

## 1888470000_Single
designator E?
OMNIMATE Signal - series LSF; PartNumber: 1888470000; Manufacturer: Weidmueller; Short_text_for_material: LSF-SMT 3.81/04/135 1.5SN BK RL; Side_termination_characteristic: closed side; Mounting_onto_the_PCB: Reflow solder connection; Pitch_mm: 3,81 mm; Pitch_inch: 0,15 inch; No_of_poles: 4; Solder_pin_length_mm: 1,5 mm; Contact_material: Cu-Leg; Contact_surface: tinned; Insulating_material: LCP GF; UL_94_flammability_rating: V-0; Rated_voltage_for_surge_voltage_class_pollution_degree_II_2: 320 V; Rated_current_min_no_of_poles_TU_20_deg_C: 17,5 A; Solid_min_H05_07_V_U: 0,2 mm²; Solid_max_H05_07_V_U: 1,5 mm²; Rated_voltage_use_group_B_UL_1059: 300 V; Rated_current_use_group_B_UL_1059: 12 A; Wire_cross_section_AWG_min_UL_1059: AWG 24; Wire_cross_section_AWG_max_UL_1059: AWG 16; PackageReference: LSF_SMT_3_81_135_04; Colour: Black; Packaging: Tape; Qty: 190 PCS; Revision: V1; ComponentLink1Description: Manufacturer URL; ComponentLink1URL: http://www.weidmueller.com/; ComponentLink2Description: URL Link1; ComponentLink2URL: http://catalog.weidmueller.com/catalog/Start.do?localeId=en&ObjectID=1888470000
footprint LSF_SMT_3_81_135_04 (OMNIMATE Signal - Serie LSF  LSF-SMT 3.81/04/135 1.5)
part A pins: A1
part B pins: A2
part C pins: A3
part D pins: A4
1 alternate drawing of the same symbol

## 1888510000
designator E?
OMNIMATE Signal - series LSF; PartNumber: 1888510000; Manufacturer: Weidmueller; Short_text_for_material: LSF-SMT 3.81/08/135 1.5SN BK RL; Side_termination_characteristic: closed side; Mounting_onto_the_PCB: Reflow solder connection; Pitch_mm: 3,81 mm; Pitch_inch: 0,15 inch; No_of_poles: 8; Solder_pin_length_mm: 1,5 mm; Contact_material: Cu-Leg; Contact_surface: tinned; Insulating_material: LCP GF; UL_94_flammability_rating: V-0; Rated_voltage_for_surge_voltage_class_pollution_degree_II_2: 320 V; Rated_current_min_no_of_poles_TU_20_deg_C: 17,5 A; Solid_min_H05_07_V_U: 0,2 mm²; Solid_max_H05_07_V_U: 1,5 mm²; Rated_voltage_use_group_B_UL_1059: 300 V; Rated_current_use_group_B_UL_1059: 12 A; Wire_cross_section_AWG_min_UL_1059: AWG 24; Wire_cross_section_AWG_max_UL_1059: AWG 16; PackageReference: LSF_SMT_3_81_135_08; Colour: Black; Packaging: Tape; Qty: 190 PCS; Revision: V1; ComponentLink1Description: Manufacturer URL; ComponentLink1URL: http://www.weidmueller.com/; ComponentLink2Description: URL Link1; ComponentLink2URL: http://catalog.weidmueller.com/catalog/Start.do?localeId=en&ObjectID=1888510000
footprint LSF_SMT_3_81_135_08 (OMNIMATE Signal - Serie LSF  LSF-SMT 3.81/08/135 1.5)
pins: A1, A2, A3, A4, A5, A6, A7, A8
1 alternate drawing of the same symbol

## 1888510000_Single
designator E?
OMNIMATE Signal - series LSF; PartNumber: 1888510000; Manufacturer: Weidmueller; Short_text_for_material: LSF-SMT 3.81/08/135 1.5SN BK RL; Side_termination_characteristic: closed side; Mounting_onto_the_PCB: Reflow solder connection; Pitch_mm: 3,81 mm; Pitch_inch: 0,15 inch; No_of_poles: 8; Solder_pin_length_mm: 1,5 mm; Contact_material: Cu-Leg; Contact_surface: tinned; Insulating_material: LCP GF; UL_94_flammability_rating: V-0; Rated_voltage_for_surge_voltage_class_pollution_degree_II_2: 320 V; Rated_current_min_no_of_poles_TU_20_deg_C: 17,5 A; Solid_min_H05_07_V_U: 0,2 mm²; Solid_max_H05_07_V_U: 1,5 mm²; Rated_voltage_use_group_B_UL_1059: 300 V; Rated_current_use_group_B_UL_1059: 12 A; Wire_cross_section_AWG_min_UL_1059: AWG 24; Wire_cross_section_AWG_max_UL_1059: AWG 16; PackageReference: LSF_SMT_3_81_135_08; Colour: Black; Packaging: Tape; Qty: 190 PCS; Revision: V1; ComponentLink1Description: Manufacturer URL; ComponentLink1URL: http://www.weidmueller.com/; ComponentLink2Description: URL Link1; ComponentLink2URL: http://catalog.weidmueller.com/catalog/Start.do?localeId=en&ObjectID=1888510000
footprint LSF_SMT_3_81_135_08 (OMNIMATE Signal - Serie LSF  LSF-SMT 3.81/08/135 1.5)
part A pins: A1
part B pins: A2
part C pins: A3
part D pins: A4
part E pins: A5
part F pins: A6
part G pins: A7
part H pins: A8
1 alternate drawing of the same symbol

## 1888570000
designator E?